# Altium footprint library Connectors.PcbLib: 46 footprints (part 3 of 3)
Each footprint in its own frame and in the unit in brackets; x right, y up, seen from the top. Pads: shape width x height; smd on the part's side, far side on the other; paste and mask are expansions set on the pad; w line width, h text height; cw(c..) or ccw(c..) is an arc to the next point about the centre after c.
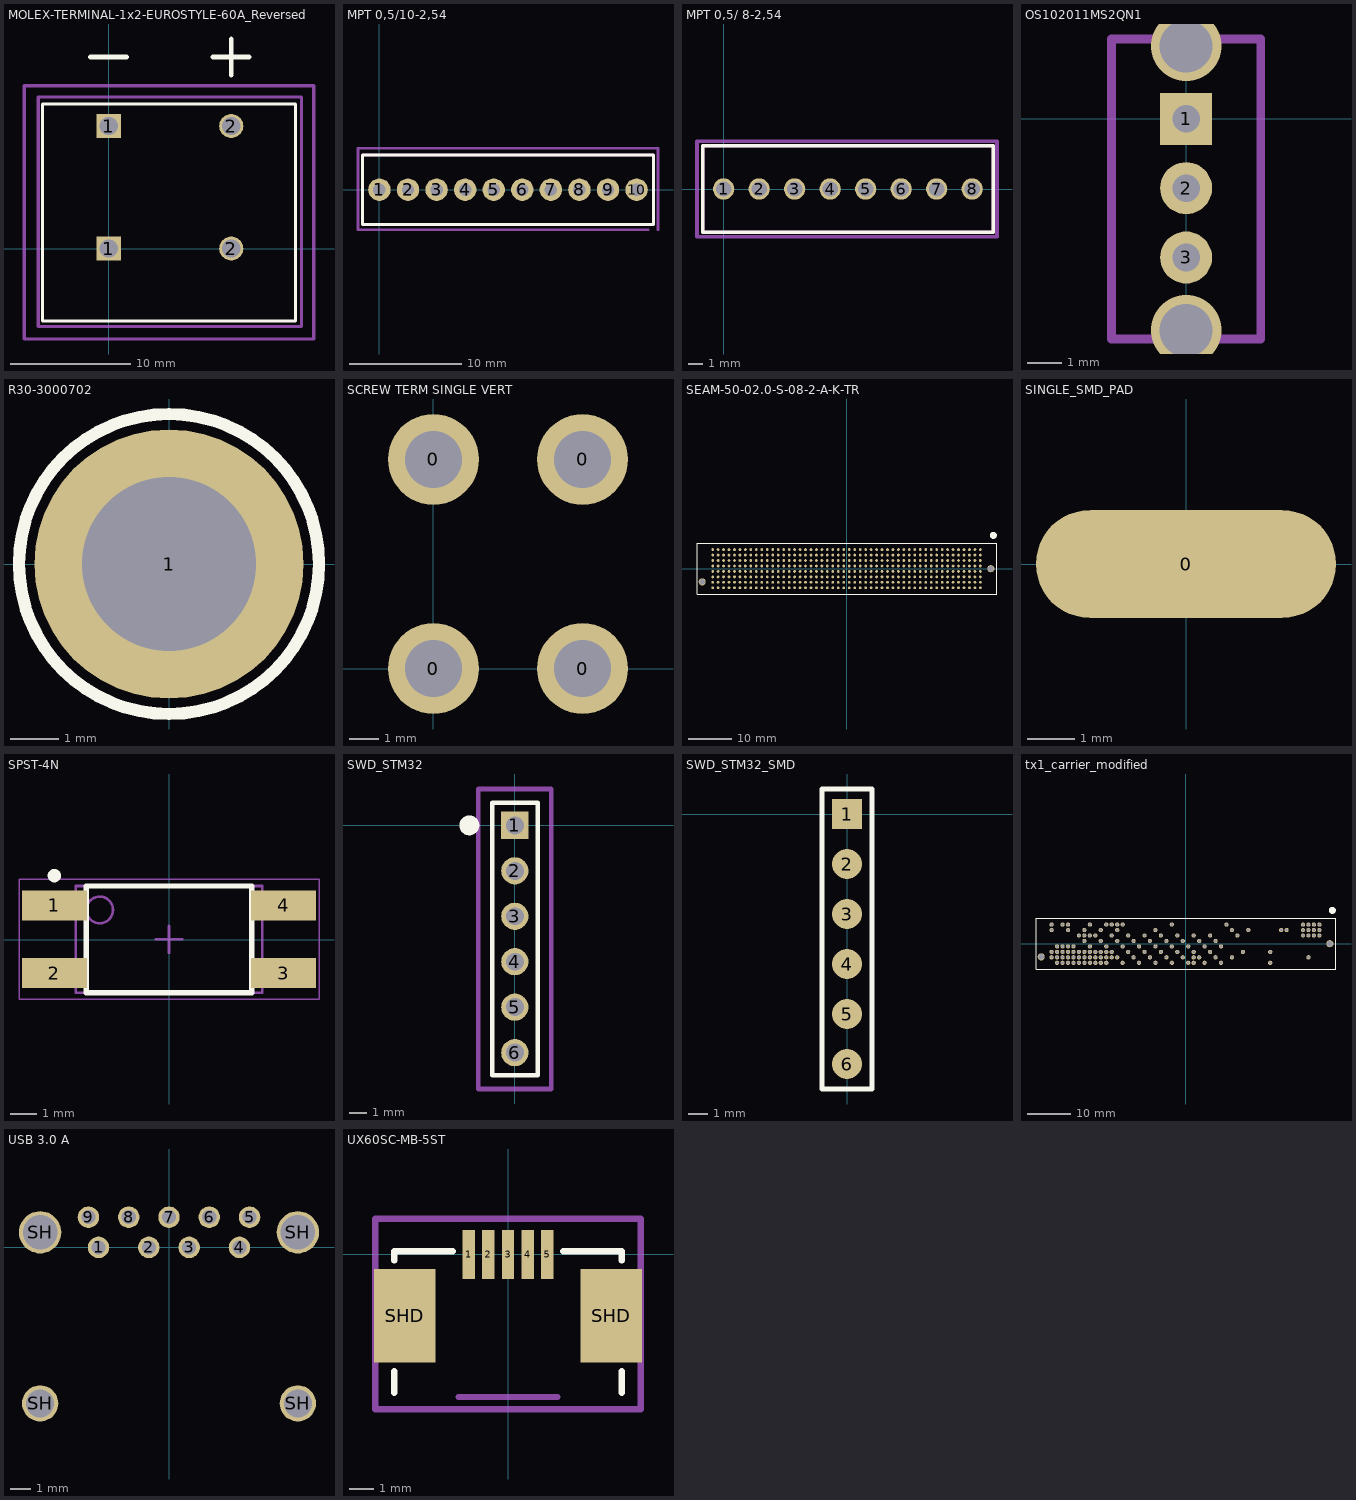
[diagram p2: the footprints below, top view; thin cyan lines are the x and y axes]

## MOLEX-TERMINAL-1x2-EUROSTYLE-60A_Reversed [mm]
height 29.7
pads (4):
  rect 2x2 hole 1.52: 1(0,0) 1(0,10.16)
  round 2 hole 1.52: 2(10.16,0) 2(10.16,10.16)
Top Overlay:
  lines w0.254: -5.5,-6 15.5,-6 15.5,12 -5.5,12 -5.5,-6
  lines w0.4: -1.5,15.875 1.5,15.875 ; 8.66,15.875 11.66,15.875 ; 10.16,14.375 10.16,17.375
Mechanical 13:
  lines w0.254: -5.84,-6.45 -5.84,12.55 16,12.55 16,-6.45 -5.84,-6.45
Mechanical 15:
  lines w0.254: -7,-7.5 17,-7.5 17,13.5 -7,13.5 -7,-7.5
3D body "399700102.stp": height 29.72, standoff -3.68, extent -5.947,-6.443 15.897,12.353

## MPT 0,5/10-2,54 [mm] "CONN TERM BLOCK 2.54MM 10POS"
height 8.5
pads (10):
  round 2 hole 1.1: 1(0,0) 2(2.54,0) 3(5.08,0) 4(7.62,0) 5(10.16,0) 6(12.7,0) 7(15.24,0) 8(17.78,0) 9(20.32,0) 10(22.86,0)
Top Overlay:
  lines w0.254: 24.205,-3.1 24.36,-2.945 ; -1.5,-3.1 24.36,-3.1 24.36,3.1 -1.5,3.1 -1.5,-3.1
Mechanical 13:
  lines w0.254: -1.5,-3.1 -1.5,3.1 24.36,3.1 24.36,-3.1 -1.5,-3.1
Mechanical 15:
  lines w0.254: 23.876,-3.556 -1.905,-3.556 -1.905,3.683 24.765,3.683 24.765,-3.556

## MPT 0,5/ 8-2,54 [mil] "CONN TERM BLOCK 2.54MM 8POS"
pads (8):
  round 60 hole 43.31: 1(0,0) 2(100,0) 3(200,0) 4(300,0) 5(400,0) 6(500,0) 7(600,0) 8(700,0)
Top Overlay:
  lines w10: -59.06,-122.05 759.06,-122.05 759.06,122.05 -59.06,122.05 -59.06,-122.05
Mechanical 13:
  lines w10: -59.06,-122.05 759.06,-122.05 759.06,122.05 -59.06,122.05 -59.06,-122.05
Mechanical 15:
  lines w10: -75,-135 -75,135 770,135 770,-135 -75,-135

## OS102011MS2QN1 [mm] "SWITCH SLIDE SPDT 100MA 12V"
height 4
pads (3):
  rect 1.5x1.5 hole 0.8: 1(0,0)
  round 1.5 hole 0.8: 2(0,-2) 3(0,-4)
via 0,-6.1 diameter 2.032 hole 1.524
via 0,2.1 diameter 2.032 hole 1.524
Mechanical 15:
  lines w0.254: -2.159,-6.35 2.15,-6.35 2.15,2.286 ; -2.15,-6.35 -2.15,2.3 2.15,2.3

## R30-3000702 [mil] "HEX STANDOFF M3 BRASS 7MM"
height 275.59
pads (1):
  round 220 hole 141.7: 1(0,0)
Top Overlay:
  circle w10: c0,0 r122.49

## SCREW TERM SINGLE VERT [mil] "Keystone Electronics 7701 - TERM W/ASSEMBLD SCREW VERT PCMNT"
height 243
pads (4):
  round 120 hole 75: 0(0,0) 0(0,276) 0(197,0) 0(197,276)
3D body "keystone-PN7701.step": height 321.92, standoff -192.49, extent -53.39,-13.97 256.61,296.03

## SEAM-50-02.0-S-08-2-A-K-TR [mil] "TX 1 carrier board connector"
height 4.6
pads (402):
  round 25 smd: A1(1225,175) A2(1175,175) A3(1125,175) A4(1075,175) A5(1025,175) A6(975,175) A7(925,175) A8(875,175) A9(825,175) A10(775,175) A11(725,175) A12(675,175) A13(625,175) A14(575,175) A15(525,175) A16(475,175) A17(425,175) A18(375,175) A19(325,175) A20(275,175) A21(225,175) A22(175,175) A23(125,175) A24(75,175) A25(25,175) A26(-25,175) A27(-75,175) A28(-125,175) A29(-175,175) A30(-225,175) A31(-275,175) A32(-325,175) A33(-375,175) A34(-425,175) A35(-475,175) A36(-525,175) A37(-575,175) A38(-625,175) A39(-675,175) A40(-725,175) A41(-775,175) A42(-825,175) A43(-875,175) A44(-925,175) A45(-975,175) A46(-1025,175) A47(-1075,175) A48(-1125,175) A49(-1175,175) A50(-1225,175) B1(1225,125) B2(1175,125) B3(1125,125) B4(1075,125) B5(1025,125) B6(975,125) B7(925,125) B8(875,125) B9(825,125) B10(775,125) B11(725,125) B12(675,125) B13(625,125) B14(575,125) B15(525,125) B16(475,125) B17(425,125) B18(375,125) B19(325,125) B20(275,125) B21(225,125) B22(175,125) B23(125,125) B24(75,125) B25(25,125) B26(-25,125) B27(-75,125) B28(-125,125) B29(-175,125) B30(-225,125) B31(-275,125) B32(-325,125) B33(-375,125) B34(-425,125) B35(-475,125) B36(-525,125) B37(-575,125) B38(-625,125) B39(-675,125) B40(-725,125) B41(-775,125) B42(-825,125) B43(-875,125) B44(-925,125) B45(-975,125) B46(-1025,125) B47(-1075,125) B48(-1125,125) B49(-1175,125) B50(-1225,125) C1(1225,75) C2(1175,75) C3(1125,75) C4(1075,75) C5(1025,75) C6(975,75) C7(925,75) C8(875,75) C9(825,75) C10(775,75) C11(725,75) C12(675,75) C13(625,75) C14(575,75) C15(525,75) C16(475,75) C17(425,75) C18(375,75) C19(325,75) C20(275,75) C21(225,75) C22(175,75) C23(125,75) C24(75,75) C25(25,75) C26(-25,75) C27(-75,75) C28(-125,75) C29(-175,75) C30(-225,75) C31(-275,75) C32(-325,75) C33(-375,75) C34(-425,75) C35(-475,75) C36(-525,75) C37(-575,75) C38(-625,75) C39(-675,75) C40(-725,75) C41(-775,75) C42(-825,75) C43(-875,75) C44(-925,75) C45(-975,75) C46(-1025,75) C47(-1075,75) C48(-1125,75) C49(-1175,75) C50(-1225,75) D1(1225,25) D2(1175,25) D3(1125,25) D4(1075,25) D5(1025,25) D6(975,25) D7(925,25) D8(875,25) D9(825,25) D10(775,25) D11(725,25) D12(675,25) D13(625,25) D14(575,25) D15(525,25) D16(475,25) D17(425,25) D18(375,25) D19(325,25) D20(275,25) D21(225,25) D22(175,25) D23(125,25) D24(75,25) D25(25,25) D26(-25,25) D27(-75,25) D28(-125,25) D29(-175,25) D30(-225,25) D31(-275,25) D32(-325,25) D33(-375,25) D34(-425,25) D35(-475,25) D36(-525,25) D37(-575,25) D38(-625,25) D39(-675,25) D40(-725,25) D41(-775,25) D42(-825,25) D43(-875,25) D44(-925,25) D45(-975,25) D46(-1025,25) D47(-1075,25) D48(-1125,25) D49(-1175,25) D50(-1225,25) E1(1225,-25) E2(1175,-25) E3(1125,-25) E4(1075,-25) E5(1025,-25) E6(975,-25) E7(925,-25) E8(875,-25) E9(825,-25) E10(775,-25) E11(725,-25) E12(675,-25) E13(625,-25) E14(575,-25) E15(525,-25) E16(475,-25) E17(425,-25) E18(375,-25) E19(325,-25) E20(275,-25) E21(225,-25) E22(175,-25) E23(125,-25) E24(75,-25) E25(25,-25) E26(-25,-25) E27(-75,-25) E28(-125,-25) E29(-175,-25) E30(-225,-25) E31(-275,-25) E32(-325,-25) E33(-375,-25) E34(-425,-25) E35(-475,-25) E36(-525,-25) E37(-575,-25) E38(-625,-25) E39(-675,-25) E40(-725,-25) E41(-775,-25) E42(-825,-25) E43(-875,-25) E44(-925,-25) E45(-975,-25) E46(-1025,-25) E47(-1075,-25) E48(-1125,-25) E49(-1175,-25) E50(-1225,-25) F1(1225,-75) F2(1175,-75) F3(1125,-75) F4(1075,-75) F5(1025,-75) F6(975,-75) F7(925,-75) F8(875,-75) F9(825,-75) F10(775,-75) F11(725,-75) F12(675,-75) F13(625,-75) F14(575,-75) F15(525,-75) F16(475,-75) F17(425,-75) F18(375,-75) F19(325,-75) F20(275,-75) F21(225,-75) F22(175,-75) F23(125,-75) F24(75,-75) F25(25,-75) F26(-25,-75) F27(-75,-75) F28(-125,-75) F29(-175,-75) F30(-225,-75) F31(-275,-75) F32(-325,-75) F33(-375,-75) F34(-425,-75) F35(-475,-75) F36(-525,-75) F37(-575,-75) F38(-625,-75) F39(-675,-75) F40(-725,-75) F41(-775,-75) F42(-825,-75) F43(-875,-75) F44(-925,-75) F45(-975,-75) F46(-1025,-75) F47(-1075,-75) F48(-1125,-75) F49(-1175,-75) F50(-1225,-75) G1(1225,-125) G2(1175,-125) G3(1125,-125) G4(1075,-125) G5(1025,-125) G6(975,-125) G7(925,-125) G8(875,-125) G9(825,-125) G10(775,-125) G11(725,-125) G12(675,-125) G13(625,-125) G14(575,-125) G15(525,-125) G16(475,-125) G17(425,-125) G18(375,-125) G19(325,-125) G20(275,-125) G21(225,-125) G22(175,-125) G23(125,-125) G24(75,-125) G25(25,-125) G26(-25,-125) G27(-75,-125) G28(-125,-125) G29(-175,-125) G30(-225,-125) G31(-275,-125) G32(-325,-125) G33(-375,-125) G34(-425,-125) G35(-475,-125) G36(-525,-125) G37(-575,-125) G38(-625,-125) G39(-675,-125) G40(-725,-125) G41(-775,-125) G42(-825,-125) G43(-875,-125) G44(-925,-125) G45(-975,-125) G46(-1025,-125) G47(-1075,-125) G48(-1125,-125) G49(-1175,-125) G50(-1225,-125) H1(1225,-175) H2(1175,-175) H3(1125,-175) H4(1075,-175) H5(1025,-175) H6(975,-175) H7(925,-175) H8(875,-175) H9(825,-175) H10(775,-175) H11(725,-175) H12(675,-175) H13(625,-175) H14(575,-175) H15(525,-175) H16(475,-175) H17(425,-175) H18(375,-175) H19(325,-175) H20(275,-175) H21(225,-175) H22(175,-175) H23(125,-175) H24(75,-175) H25(25,-175) H26(-25,-175) H27(-75,-175) H28(-125,-175) H29(-175,-175) H30(-225,-175) H31(-275,-175) H32(-325,-175) H33(-375,-175) H34(-425,-175) H35(-475,-175) H36(-525,-175) H37(-575,-175) H38(-625,-175) H39(-675,-175) H40(-725,-175) H41(-775,-175) H42(-825,-175) H43(-875,-175) H44(-925,-175) H45(-975,-175) H46(-1025,-175) H47(-1075,-175) H48(-1125,-175) H49(-1175,-175) H50(-1225,-175)
  round 65 hole 50: ""(-1320.5,-120) ""(1320.5,0)
Top Overlay:
  circle w32: c1344,305 r16.03
  lines w10: 1377,231 1377,-235 -1368,-235 -1368,233 1377,233
3D body "SEAM-50-02.0-S-08-2-A-K-TR.stp": height 218, standoff -53, extent -1348.5,-239.99 1382.5,238

## SINGLE_SMD_PAD [mil]
pads (1):
  oval 250x90 smd: 0(0,0)

## SPST-4N [mm] "For SPST-4DIP"
pads (4):
  rect 2.44x1.13 smd: 1(-4.3,1.295) 2(-4.3,-1.245) 3(4.3,-1.245) 4(4.3,1.295)
Top Overlay:
  circle w0.25: c-4.3,2.41 r0.125
  lines w0.2: -3.1,-1.975 -3.1,2.025 3.1,2.025 3.1,-1.975 -3.1,-1.975
Mechanical 13:
  circle w0.1: c-2.6,1.125 r0.5
  lines w0.1: -3.5,-1.975 -3.5,2.025 3.5,2.025 3.5,-1.975 -3.5,-1.975
Mechanical 15:
  lines w0.05: -5.625,-2.225 -5.625,2.275 5.625,2.275 5.625,-2.225 -5.625,-2.225
  lines w0.1: -0.5,0.025 0.5,0.025 ; 0,-0.475 0,0.525
3D body: height 3.8, standoff 0.55, extent -3.5,-1.975 3.5,2.025

## SWD_STM32 [mil] "SWD connector matching the pinout on STM Discovery Boards"
pads (6):
  rect 60x60 hole 39.37: 1(0,0)
  round 60 hole 39.37: 2(0,-100) 3(0,-200) 4(0,-300) 5(0,-400) 6(0,-500)
Top Overlay:
  circle w23.62: c-100,0 r10
  lines w10: -50,-550 -50,50 50,50 50,-550 -50,-550
Mechanical 15:
  lines w10: -80,-580 -80,80 80,80 80,-580 -80,-580

## SWD_STM32_SMD [mil] "SWD connector matching the pinout on STM Discovery Boards"
pads (6):
  rect 60x60 smd: 1(0,0)
  round 60 smd: 2(0,-100) 3(0,-200) 4(0,-300) 5(0,-400) 6(0,-500)
Top Overlay:
  lines w10: -50,-550 -50,50 50,50 50,-550 -50,-550

## tx1_carrier_modified [mil] "TX 1 carrier board connector modified to remove pads"
height 4.6
pads (129):
  round 39 hole 25: A1(1225,175) A2(1175,175) A3(1125,175) A4(1075,175) A18(375,175) A28(-125,175) A37(-575,175) A38(-625,175) A39(-675,175) A40(-725,175) A43(-875,175) A47(-1075,175) A48(-1125,175) A50(-1225,175) B1(1225,125) B2(1175,125) B3(1125,125) B4(1075,125) B7(925,125) B8(875,125) B14(575,125) B17(425,125) B31(-275,125) B38(-625,125) B41(-775,125) B44(-925,125) B47(-1075,125) B50(-1225,125) C1(1225,75) C2(1175,75) C3(1125,75) C4(1075,75) C16(475,75) C21(225,75) C24(75,75) C27(-75,75) C30(-225,75) C33(-375,75) C36(-525,75) C39(-675,75) C42(-825,75) C43(-875,75) C44(-925,75) C45(-975,75) D20(275,25) D23(125,25) D26(-25,25) D29(-175,25) D32(-325,25) D35(-475,25) D38(-625,25) D41(-775,25) D44(-925,25) E19(325,-25) E22(175,-25) E25(25,-25) E28(-125,-25) E31(-275,-25) E34(-425,-25) E37(-575,-25) E40(-725,-25) E43(-875,-25) E46(-1025,-25) E47(-1075,-25) E48(-1125,-25) E49(-1175,-25) F10(775,-75) F15(525,-75) F21(225,-75) F24(75,-75) F27(-75,-75) F30(-225,-75) F33(-375,-75) F36(-525,-75) F39(-675,-75) F40(-725,-75) F41(-775,-75) F42(-825,-75) F43(-875,-75) F44(-925,-75) F45(-975,-75) F46(-1025,-75) F47(-1075,-75) F48(-1125,-75) F49(-1175,-75) F50(-1225,-75) G3(1125,-125) G17(425,-125) G20(275,-125) G23(125,-125) G24(75,-125) G26(-25,-125) G29(-175,-125) G32(-325,-125) G35(-475,-125) G38(-625,-125) G39(-675,-125) G40(-725,-125) G41(-775,-125) G42(-825,-125) G43(-875,-125) G44(-925,-125) G45(-975,-125) G46(-1025,-125) G47(-1075,-125) G48(-1125,-125) G49(-1175,-125) G50(-1225,-125) H10(775,-175) H19(325,-175) H22(175,-175) H24(75,-175) H25(25,-175) H28(-125,-175) H31(-275,-175) H34(-425,-175) H37(-575,-175) H40(-725,-175) H41(-775,-175) H42(-825,-175) H43(-875,-175) H44(-925,-175) H45(-975,-175) H46(-1025,-175) H47(-1075,-175) H48(-1125,-175) H49(-1175,-175)
  round 65 hole 50: ""(-1320.5,-120) ""(1320.5,0)
Top Overlay:
  circle w32: c1344,305 r16.03
  lines w10: 1377,231 1377,-235 -1368,-235 -1368,233 1377,233
3D body "SEAM-50-02.0-S-08-2-A-K-TR.stp": height 218, standoff -53, extent -1348.5,-239.99 1382.5,238

## USB 3.0 A [mm] "0483930003"
height 6.86
pads (13):
  round 1.067 hole 0.7: 1(-3.5,0) 2(-1,0) 3(1,0) 4(3.5,0) 5(4,1.5) 6(2,1.5) 7(0,1.5) 8(-2,1.5) 9(-4,1.5)
  round 1.8 hole 1.4: SH(-6.4,-7.75) SH(6.4,-7.75)
  round 2.1 hole 1.7: SH(-6.4,0.75) SH(6.4,0.75)
3D body "483930003.stp": height 7, standoff -1.04, extent -6.9,-11.725 6.9,2.525

## UX60SC-MB-5ST [mm] "USB Mini-B Recepticle"
pads (7):
  rect 0.5x2 smd: 1(-1.6,0) 2(-0.8,0) 3(0,0) 4(0.8,0) 5(1.6,0)
  rect 2.5x3.8 smd: SHD(-4.2,-2.5) SHD(4.2,-2.5)
Top Overlay:
  lines w0.254: -4.625,-5.625 -4.625,-4.75 ; -4.625,-0.25 -4.625,0.125 -2.25,0.125 ; 2.25,0.125 4.625,0.125 4.625,-0.25 ; 4.625,-5.625 4.625,-4.75
Mechanical 1:
  lines w0.254: -2,-5.8 2,-5.8
Mechanical 15:
  lines w0.254: -5.4,-6.3 5.4,-6.3 5.4,1.45 -5.4,1.45 -5.4,-6.3
3D body "UX60SC-MB-5ST.stp": height 3.95, standoff 0, extent -4.9,-6.605 4.9,0.395